# Altium footprint library Cty1.PcbLib: 1378 footprints (part 62 of 87)
Each footprint in its own frame and in the unit in brackets; x right, y up, seen from the top. Pads: shape width x height; smd on the part's side, far side on the other; paste and mask are expansions set on the pad; w line width, h text height; cw(c..) or ccw(c..) is an arc to the next point about the centre after c.
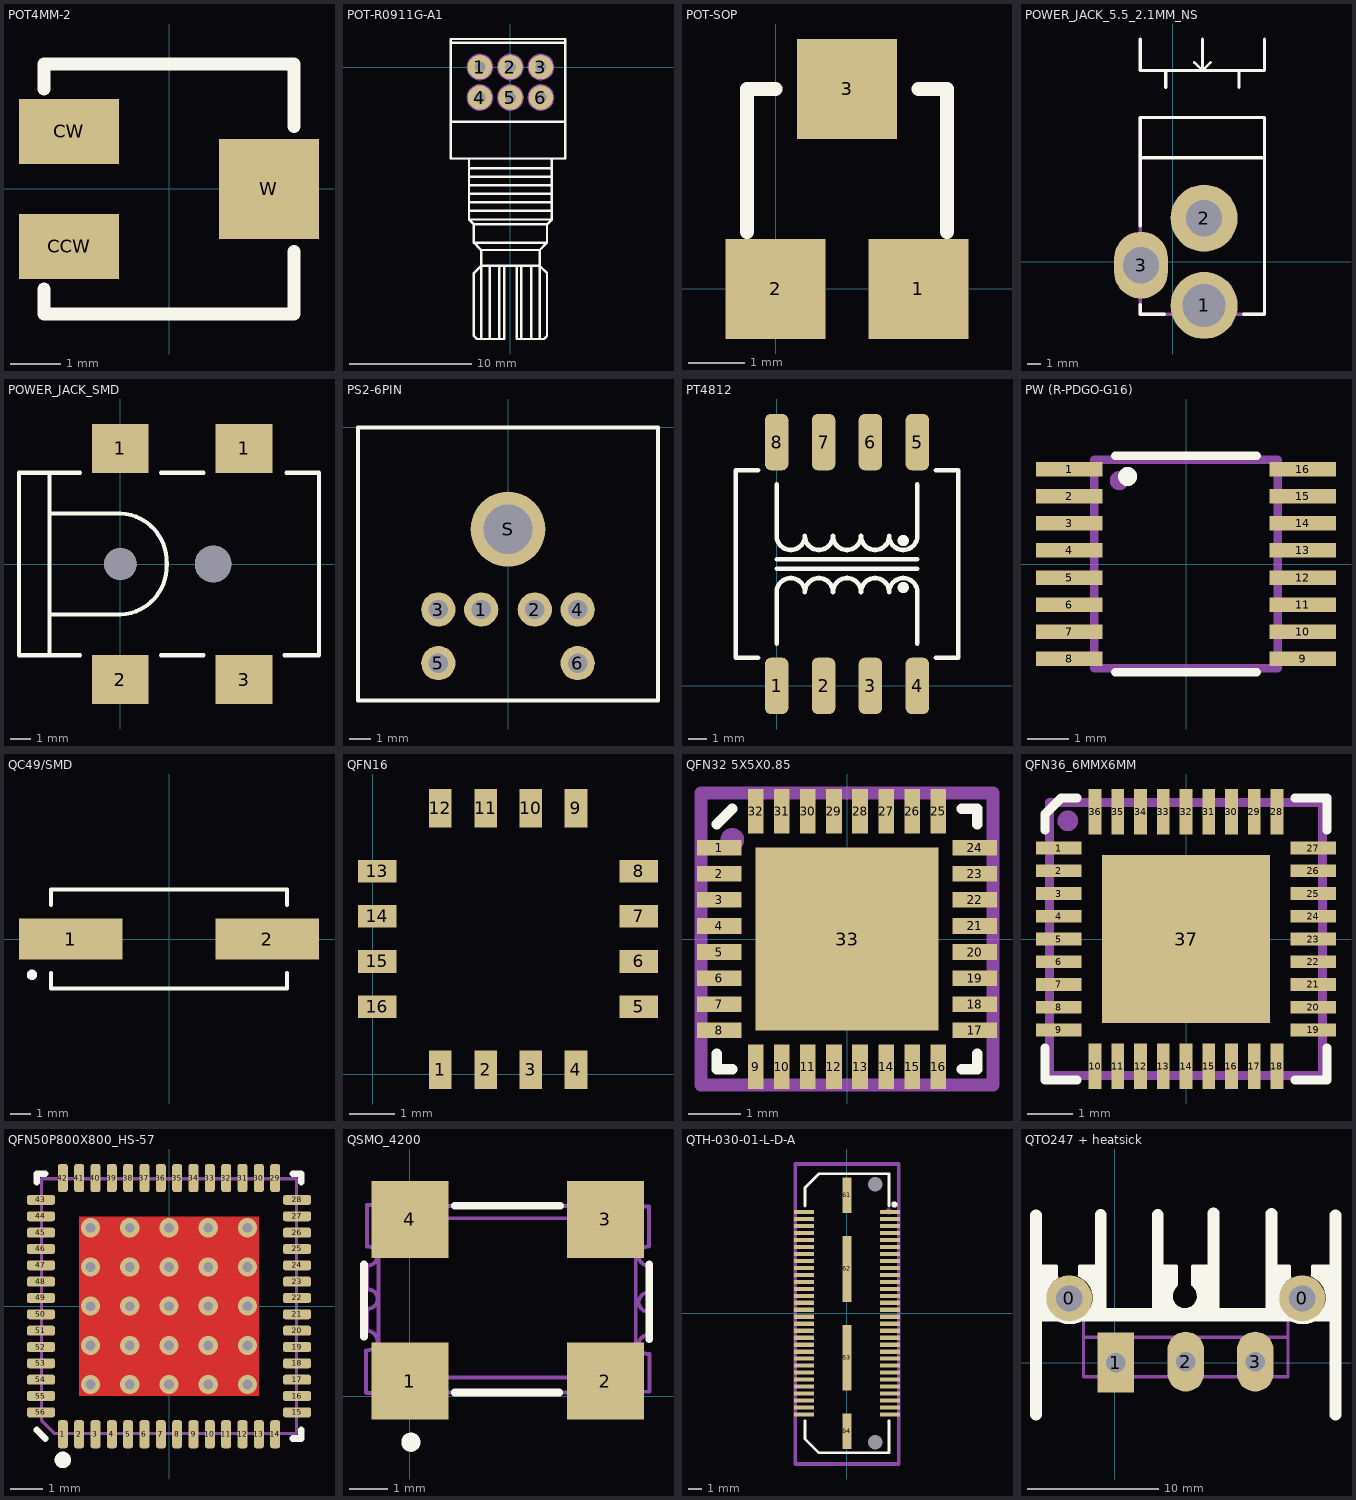
[diagram p61: the footprints below, top view; thin cyan lines are the x and y axes]

## POT4MM-2 [mm]
pads (3):
  rect 2x1.3 smd: CCW(-2,-1.15) CW(-2,1.15)
  rect 2x2 smd: W(2,0)
Top Overlay:
  lines w0.254: -2.5,-2 -2.5,-2.5 2.5,-2.5 2.5,-1.25 ; -2.5,2 -2.5,2.5 2.5,2.5 2.5,1.25

## POT-R0911G-A1 [mm]
pads (6):
  round 2 hole 0.9: 1(-2.5,0) 2(0,0) 3(2.5,0) 4(-2.5,-2.5) 5(0,-2.5) 6(2.5,-2.5)
Top Overlay:
  lines w0.2: -4.9,-4.5 4.5,-4.5 ; -4.9,2 4.5,2 ; -3.4,-11.8 3.4,-11.8 3.4,-12.5 ; -3.4,-11.1 3.4,-11.1 ; -3.4,-10.4 3.4,-10.4 ; -3.4,-9.7 3.4,-9.7 ; -3.4,-9 3.4,-9 ; -3.4,-8.3 3.4,-8.3 ; -3.4,-7.5 -3.4,-12.5 ; -2.4,-22.3 -2.4,-16.3 ; -1.7,-22.3 -1.7,-16.3 ; -0.9,-22.3 -0.9,-16.3 ; -0.5,-16.3 -0.5,-22.3 -2.75,-22.3 -3,-22.05 -3,-16.9 -2.4,-16.3 ; 0.5,-16.3 0.5,-22.3 2.75,-22.3 3,-22.05 3,-16.9 2.4,-16.3 ; 0.9,-22.3 0.9,-16.3 ; 1.7,-22.3 1.7,-16.3 ; 2.4,-22.3 2.4,-16.3 ; 3.4,-7.5 3.4,-12.5 ; -3.4,-12.5 -3,-12.9 ; -3.4,-12.5 0,-12.5 3.4,-12.5 ; -3,-14.4 -2.4,-15 ; -3,-14.4 -3,-12.9 ; -3,-14.4 0,-14.4 3,-14.4 ; -3,-12.9 0,-12.9 3,-12.9 ; -2.4,-16.3 -2.4,-15 ; -2.4,-16.3 0,-16.3 2.4,-16.3 ; -2.4,-15 0,-15 2.4,-15 ; 2.4,-16.3 2.4,-15 ; 2.4,-15 3,-14.4 ; 3,-14.4 3,-12.9 ; 3,-12.9 3.4,-12.5 ; -4.9,-7.5 4.5,-7.5 4.5,2.3 -4.9,2.3 -4.9,-7.5
Mechanical 7:
  circle w0.2: c-2.5,0 r1
  circle w0.2: c0,0 r1
  circle w0.2: c2.5,0 r1
  circle w0.2: c-2.5,-2.5 r1
  circle w0.2: c0,-2.5 r1
  circle w0.2: c2.5,-2.5 r1
  lines w0.1: -4.9,-4.5 4.5,-4.5 ; -4.9,2 4.5,2 ; -3.4,-11.8 3.4,-11.8 3.4,-12.5 ; -3.4,-11.1 3.4,-11.1 ; -3.4,-10.4 3.4,-10.4 ; -3.4,-9.7 3.4,-9.7 ; -3.4,-9 3.4,-9 ; -3.4,-8.3 3.4,-8.3 ; -3.4,-7.5 -3.4,-12.5 ; -2.4,-22.3 -2.4,-16.3 ; -1.7,-22.3 -1.7,-16.3 ; -0.9,-22.3 -0.9,-16.3 ; -0.5,-16.3 -0.5,-22.3 -2.75,-22.3 -3,-22.05 -3,-16.9 -2.4,-16.3 ; 0.5,-16.3 0.5,-22.3 2.75,-22.3 3,-22.05 3,-16.9 2.4,-16.3 ; 0.9,-22.3 0.9,-16.3 ; 1.7,-22.3 1.7,-16.3 ; 2.4,-22.3 2.4,-16.3 ; 3.4,-7.5 3.4,-12.5 ; -3.4,-12.5 0,-12.5 3.4,-12.5 ; -3.4,-12.5 -3,-12.9 ; -3,-14.4 0,-14.4 3,-14.4 ; -3,-14.4 -3,-12.9 ; -3,-14.4 -2.4,-15 ; -3,-12.9 0,-12.9 3,-12.9 ; -2.4,-16.3 0,-16.3 2.4,-16.3 ; -2.4,-16.3 -2.4,-15 ; -2.4,-15 0,-15 2.4,-15 ; 2.4,-16.3 2.4,-15 ; 2.4,-15 3,-14.4 ; 3,-14.4 3,-12.9 ; 3,-12.9 3.4,-12.5 ; -4.9,-7.5 -4.9,2.3 4.5,2.3 4.5,-7.5 -4.9,-7.5
3D body "Potentiometer 2x5K Linear.stp": height 12.64, standoff -2.5, extent -5.725,-27.97 5.764,1.504

## POT-SOP [mil]
pads (3):
  rect 70x70 smd: 1(100,0) 2(0,0) 3(50,140)
Top Overlay:
  lines w10: -20,40 -20,140 0,140 ; 100,140 120,140 120,40

## POWER_JACK_5.5_2.1MM_NS [mm]
pads (3):
  round 5 hole 3.2: 1(2.35,-3.25)
  round 5 hole 2.7: 2(2.35,3.25)
  oval 4x5 hole 2.7: 3(-2.35,-0.25)
Top Overlay:
  lines w0.2: 1.625,14.85 2.225,14.25 ; 2.225,16.6 2.225,14.25 ; 2.825,14.85 2.225,14.25
  lines w0.254: -2.4,-3.2 -2.4,-3.9 -0.6,-3.9 ; -2.4,2.7 -2.4,10.75 6.85,10.75 6.85,-3.9 5.3,-3.9 ; -2.4,7.75 6.85,7.75 ; -2.4,16.6 -2.4,14.25 6.85,14.25 6.85,16.6 ; -0.5,13 -0.5,14.25 ; 4.95,13 4.95,14.25
Mechanical 16:
  lines w0.254: -2.4,-3.9 6.85,-3.9 6.85,10.75 -2.4,10.75 -2.4,-3.9
Mechanical 29:
  text ".Designator" at -0.27,1.34 h1.52
3D body "CUI-PJ-002AH.step": height 11, standoff -3.5, extent -2.55,-3.9 6.85,10.5

## POWER_JACK_SMD [mm]
pads (6):
  rect 2.8x2.4 smd: 1(-0.003,5.714) 1(6.097,5.714) 2(-0.003,-5.686) 3(6.097,-5.686)
  round 1.6 hole 1.6 unplated: ""(-0.003,0.014)
  round 1.803 hole 1.803 unplated: ""(4.569,0.014)
Top Overlay:
  lines w0.203: -2.003,-4.486 -3.503,-4.486 ; -2.003,4.515 -3.503,4.515 ; 1.997,-4.486 4.097,-4.486 ; 1.997,4.515 4.097,4.515 ; 8.097,-4.486 9.797,-4.486 9.797,4.515 8.197,4.515 ; -3.503,-4.486 -5.003,-4.486 -5.003,4.515 -3.503,4.515 ; -3.503,-4.486 -3.503,-2.486 ; -3.503,-2.486 -3.503,2.515 ; -3.503,-2.486 -0.003,-2.486 ccw(c-0.11,-0.093) 2.283,0.014 ccw(c-0.11,0.121) -0.003,2.514 -3.503,2.515 ; -3.503,2.515 -3.503,4.515
3D body "smd power jack.step": height 11.06, standoff 0.11, extent -5.002,-4.478 8.536,4.589

## PS2-6PIN [mm] "PS2 Connector"
height 13
pads (7):
  round 1.6 hole 0.9: 1(-1.25,-8.5) 2(1.25,-8.5) 3(-3.25,-8.5) 4(3.25,-8.5) 5(-3.25,-11) 6(3.25,-11)
  round 3.5 hole 2.3: S(0,-4.75)
Top Overlay:
  lines w0.2: -7,-12.75 7,-12.75 7,0 -7,0 -7,-12.75

## PT4812 [mm]
pads (8):
  rrect50% 1.27x3.05 smd: 1(0,0) 2(2.54,0) 3(5.08,0) 4(7.62,0) 5(7.62,13.21) 6(5.08,13.21) 7(2.54,13.21) 8(0,13.21)
Top Overlay:
  circle w0.254: c6.858,5.334 r0.18
  circle w0.254: c6.858,7.874 r0.18
  lines w0.254: -1.016,1.524 -2.22,1.524 -2.22,11.686 -1.016,11.686 ; 0,2.286 0,5.08 cw(c0.762,5.08) 0.762,5.842 cw(c0.762,5.08) 1.524,5.08 cw(c2.286,5.08) 2.286,5.842 cw(c2.286,5.08) 3.048,5.08 cw(c3.81,5.08) 3.81,5.842 cw(c3.81,5.08) 4.572,5.08 cw(c5.334,5.08) 5.334,5.842 cw(c5.334,5.08) 6.096,5.08 cw(c6.858,5.08) 6.858,5.842 cw(c6.858,5.08) 7.62,5.08 7.62,2.286 ; 0,6.35 7.62,6.35 ; 0,6.858 7.62,6.858 0.508,6.858 ; 0,10.922 0,8.128 ccw(c0.762,8.128) 0.762,7.366 ccw(c0.762,8.128) 1.524,8.128 ccw(c2.286,8.128) 2.286,7.366 ccw(c2.286,8.128) 3.048,8.128 ccw(c3.81,8.128) 3.81,7.366 ccw(c3.81,8.128) 4.572,8.128 ccw(c5.334,8.128) 5.334,7.366 ccw(c5.334,8.128) 6.096,8.128 ccw(c6.858,8.128) 6.858,7.366 ccw(c6.858,8.128) 7.62,8.128 7.62,10.922 ; 6.731,5.334 7.038,5.334 ; 6.731,7.874 7.038,7.874 ; 8.636,1.524 9.84,1.524 9.84,11.686 8.636,11.686
3D body "PPT4812.stp": height 8.86, standoff 0.02, extent -2.281,-0.289 9.779,13.243

## PW (R-PDGO-G16) [mm] "Creator MM"
height 1.2
pads (16):
  rect 1.6x0.35 smd mask+0.07: 1(-2.8,2.275) 2(-2.8,1.625) 3(-2.8,0.975) 4(-2.8,0.325) 5(-2.8,-0.325) 6(-2.8,-0.975) 7(-2.8,-1.625) 8(-2.8,-2.275) 9(2.8,-2.275) 10(2.8,-1.625) 11(2.8,-0.975) 12(2.8,-0.325) 13(2.8,0.325) 14(2.8,0.975) 15(2.8,1.625) 16(2.8,2.275)
Top Overlay:
  circle w0.254: c-1.4,2.1 r0.1
  lines w0.2: -1.7,-2.6 1.7,-2.6 ; -1.7,2.6 1.7,2.6
Mechanical 16:
  circle w0.254: c-1.6,2 r0.1
  lines w0.2: -2.2,-2.5 2.2,-2.5 2.2,2.5 -2.2,2.5 -2.2,-2.5
Mechanical 29:
  text ".Designator" at 0.7,0.5 h1
3D body "mtc16.stp": height 0.99, standoff -0.01, extent -3.198,-2.5 3.222,2.5

## QC49/SMD [mm]
pads (2):
  rect 5x2 smd: 1(-4.75,0) 2(4.75,0)
Top Overlay:
  circle w0.25: c-6.625,-1.73 r0.125
  lines w0.2: -5.7,-1.65 -5.7,-2.4 5.7,-2.4 5.7,-1.65 ; -5.7,1.65 -5.7,2.4 5.7,2.4 5.7,1.65

## QFN16 [mm] "QFN 16 LEAD 6x6mm"
height 2
pads (16):
  rect 0.5x0.85 smd: 1(1.5,0.104) 2(2.5,0.104) 3(3.5,0.104) 4(4.5,0.104) 9(4.5,5.89) 10(3.5,5.89) 11(2.5,5.89) 12(1.5,5.89)
  rect 0.85x0.5 smd: 5(5.89,1.5) 6(5.89,2.5) 7(5.89,3.5) 8(5.89,4.5) 13(0.1,4.5) 14(0.1,3.5) 15(0.1,2.5) 16(0.1,1.5)
3D body: height 0.8, standoff 0, extent 0,0 6,6

## QFN32 5X5X0.85 [mm]
pads (33):
  rect 0.85x0.3 smd mask+0.025: 1(-2.45,1.75) 2(-2.45,1.25) 3(-2.45,0.75) 4(-2.45,0.25) 5(-2.45,-0.25) 6(-2.45,-0.75) 7(-2.45,-1.25) 8(-2.45,-1.75) 17(2.45,-1.75) 18(2.45,-1.25) 19(2.45,-0.75) 20(2.45,-0.25) 21(2.45,0.25) 22(2.45,0.75) 23(2.45,1.25) 24(2.45,1.75)
  rect 0.3x0.85 smd mask+0.025: 9(-1.75,-2.45) 10(-1.25,-2.45) 11(-0.75,-2.45) 12(-0.25,-2.45) 13(0.25,-2.45) 14(0.75,-2.45) 15(1.25,-2.45) 16(1.75,-2.45) 25(1.75,2.45) 26(1.25,2.45) 27(0.75,2.45) 28(0.25,2.45) 29(-0.25,2.45) 30(-0.75,2.45) 31(-1.25,2.45) 32(-1.75,2.45)
  rect 3.5x3.5 smd paste-10 mask+0.025: 33(0,0)
Top Overlay:
  lines w0.2: -2.5,-2.2 -2.5,-2.5 -2.2,-2.5 ; -2.5,2.2 -2.2,2.5 ; 2.2,-2.5 2.5,-2.5 2.5,-2.2 ; 2.2,2.5 2.5,2.5 2.5,2.2
Top Paste:
  region: 1.7,-0.1 0.1,-0.1 0.1,-1.7 1.7,-1.7
  region: -0.1,-1.7 -0.1,-0.1 -1.7,-0.1 -1.7,-1.7
  region: 0.1,1.7 0.1,0.1 1.7,0.1 1.7,1.7
  rectangle: -1.7,0.1 -0.1,1.7
Mechanical 16:
  circle w0.254: c-2.2,1.9 r0.1
  lines w0.254: -2.8,-2.8 2.8,-2.8 2.8,2.8 -2.8,2.8 -2.8,-2.8
Mechanical 29:
  text ".Designator" at -1.4,-0.6 h1.2
3D body: height 0.9, standoff 0, extent -2.5,-2.5 2.5,2.5

## QFN36_6MMX6MM [mm] "Creator MM"
pads (37):
  rect 1x0.28 smd mask+0.025: 1(-2.8,2) 2(-2.8,1.5) 3(-2.8,1) 4(-2.8,0.5) 5(-2.8,0) 6(-2.8,-0.5) 7(-2.8,-1) 8(-2.8,-1.5) 9(-2.8,-2) 19(2.8,-2) 20(2.8,-1.5) 21(2.8,-1) 22(2.8,-0.5) 23(2.8,0) 24(2.8,0.5) 25(2.8,1) 26(2.8,1.5) 27(2.8,2)
  rect 0.28x1 smd mask+0.025: 10(-2,-2.8) 11(-1.5,-2.8) 12(-1,-2.8) 13(-0.5,-2.8) 14(0,-2.8) 15(0.5,-2.8) 16(1,-2.8) 17(1.5,-2.8) 18(2,-2.8) 28(2,2.8) 29(1.5,2.8) 30(1,2.8) 31(0.5,2.8) 32(0,2.8) 33(-0.5,2.8) 34(-1,2.8) 35(-1.5,2.8) 36(-2,2.8)
  rect 3.7x3.7 smd paste-10 mask+0.025: 37(0,0)
Top Overlay:
  lines w0.2: -3.1,-2.4 -3.1,-3.1 -2.4,-3.1 ; -3.1,2.4 -3.1,2.75 -2.75,3.1 -2.4,3.1 ; 2.4,-3.1 3.1,-3.1 3.1,-2.4 ; 2.4,3.1 3.1,3.1 3.1,2.4
Top Paste:
  rectangle: -1.7,0.1 -0.1,1.7
  region: -0.1,-1.7 -0.1,-0.1 -1.7,-0.1 -1.7,-1.7
  region: 1.7,-0.1 0.1,-0.1 0.1,-1.7 1.7,-1.7
  region: 0.1,1.7 0.1,0.1 1.7,0.1 1.7,1.7
Mechanical 16:
  circle w0.254: c-2.6,2.6 r0.1
  lines w0.2: -3,-3 -3,3 3,3 3,-3 -3,-3
Mechanical 29:
  text ".Designator" at -1.2,-0.6 h1.2
3D body "QFN36 (6x6).step": height 0.9, standoff 0.01, extent -3.103,-3.103 3.102,3.102

## QFN50P800X800_HS-57 [mm]
pads (56):
  rrect50% 0.305x0.86 smd mask+0.051: 1(-3.25,-3.92) 14(3.25,-3.92) 29(3.25,3.92) 42(-3.25,3.92)
  rrect50% 0.305x0.86 smd mask+0.038: 2(-2.75,-3.92) 3(-2.25,-3.92) 4(-1.75,-3.92) 5(-1.25,-3.92) 6(-0.75,-3.92) 7(-0.25,-3.92) 8(0.25,-3.92) 9(0.75,-3.92) 10(1.25,-3.92) 11(1.75,-3.92) 12(2.25,-3.92) 13(2.75,-3.92) 30(2.75,3.92) 31(2.25,3.92) 32(1.75,3.92) 33(1.25,3.92) 34(0.75,3.92) 35(0.25,3.92) 36(-0.25,3.92) 37(-0.75,3.92) 38(-1.25,3.92) 39(-1.75,3.92) 40(-2.25,3.92) 41(-2.75,3.92)
  rrect50% 0.86x0.305 smd mask+0.051: 15(3.92,-3.25) 28(3.92,3.25) 43(-3.92,3.25) 56(-3.92,-3.25)
  rrect50% 0.86x0.305 smd mask+0.038: 16(3.92,-2.75) 17(3.92,-2.25) 18(3.92,-1.75) 19(3.92,-1.25) 20(3.92,-0.75) 21(3.92,-0.25) 22(3.92,0.25) 23(3.92,0.75) 24(3.92,1.25) 25(3.92,1.75) 26(3.92,2.25) 27(3.92,2.75) 44(-3.92,2.75) 45(-3.92,2.25) 46(-3.92,1.75) 47(-3.92,1.25) 48(-3.92,0.75) 49(-3.92,0.25) 50(-3.92,-0.25) 51(-3.92,-0.75) 52(-3.92,-1.25) 53(-3.92,-1.75) 54(-3.92,-2.25) 55(-3.92,-2.75)
via -2.4,-1.2 diameter 0.584 hole 0.3
via -2.4,0 diameter 0.584 hole 0.3
via -2.4,-2.4 diameter 0.584 hole 0.3
via -2.4,1.2 diameter 0.584 hole 0.3
via -2.4,2.4 diameter 0.584 hole 0.3
via -1.2,-1.2 diameter 0.584 hole 0.3
via -1.2,0 diameter 0.584 hole 0.3
via -1.2,-2.4 diameter 0.584 hole 0.3
via -1.2,1.2 diameter 0.584 hole 0.3
via -1.2,2.4 diameter 0.584 hole 0.3
via 0,-1.2 diameter 0.584 hole 0.3
via 0,0 diameter 0.584 hole 0.3
via 0,-2.4 diameter 0.584 hole 0.3
via 0,1.2 diameter 0.584 hole 0.3
via 0,2.4 diameter 0.584 hole 0.3
via 1.2,-1.2 diameter 0.584 hole 0.3
via 1.2,0 diameter 0.584 hole 0.3
via 1.2,-2.4 diameter 0.584 hole 0.3
via 1.2,1.2 diameter 0.584 hole 0.3
via 1.2,2.4 diameter 0.584 hole 0.3
via 2.4,-1.2 diameter 0.584 hole 0.3
via 2.4,0 diameter 0.584 hole 0.3
via 2.4,-2.4 diameter 0.584 hole 0.3
via 2.4,1.2 diameter 0.584 hole 0.3
via 2.4,2.4 diameter 0.584 hole 0.3
Top Layer:
  rectangle: -2.75,-2.75 2.75,2.75
Top Overlay:
  circle w0.25: c-3.25,-4.705 r0.125
  lines w0.2: -4.05,-3.79 -3.79,-4.05 ; -4.05,3.79 -4.05,4.05 -3.79,4.05 ; 3.79,-4.05 4.05,-4.05 4.05,-3.79 ; 3.79,4.05 4.05,4.05 4.05,3.79
Top Paste:
  rectangle: -2.54,-2.54 2.54,2.54
Top Solder:
  rectangle: -2.54,-2.54 2.54,2.54
Mechanical 7:
  circle w0.25: c-3.25,-4.705 r0.125
  lines w0.1: -3.9,-3.5 -3.9,3.9 3.9,3.9 3.9,-3.9 -3.5,-3.9 -3.9,-3.5
  text ".Comment" at -3.4,-3.6 h0.8
  text ".Designator" at -3.725,3.2 h0.8
3D body: height 0.55, standoff 0, extent -3.087,-3.089 -2.403,-2.406
3D body: height 0.3, standoff 0.1, extent -3.381,3.589 -3.119,3.85
3D body: height 0.2, standoff 0, extent -3.386,3.707 -3.125,4.275
3D body: height 0.2, standoff 0, extent 3.696,-3.391 4.264,-3.13
3D body: height 0.3, standoff 0.1, extent 3.601,-3.396 3.863,-3.135
3D body: height 0.2, standoff 0, extent 3.696,-2.891 4.264,-2.63
3D body: height 0.3, standoff 0.1, extent 3.601,-2.896 3.863,-2.635
3D body: height 0.2, standoff 0, extent 3.696,-2.391 4.264,-2.13
3D body: height 0.3, standoff 0.1, extent 3.601,-2.396 3.863,-2.135
3D body: height 0.2, standoff 0, extent 3.696,-1.891 4.264,-1.63
3D body: height 0.3, standoff 0.1, extent 3.601,-1.896 3.863,-1.635
3D body: height 0.2, standoff 0, extent 3.696,-1.391 4.264,-1.13
3D body: height 0.3, standoff 0.1, extent 3.601,-1.396 3.863,-1.135
3D body: height 0.2, standoff 0, extent 3.696,-0.891 4.264,-0.63
3D body: height 0.3, standoff 0.1, extent 3.601,-0.896 3.863,-0.635
3D body: height 0.2, standoff 0, extent 3.696,-0.391 4.264,-0.13
3D body: height 0.3, standoff 0.1, extent 3.601,-0.396 3.863,-0.135
3D body: height 0.2, standoff 0, extent 3.696,0.109 4.264,0.37
3D body: height 0.3, standoff 0.1, extent 3.601,0.104 3.863,0.365
3D body: height 0.2, standoff 0, extent 3.696,0.609 4.264,0.87
3D body: height 0.3, standoff 0.1, extent 3.601,0.604 3.863,0.865
3D body: height 0.2, standoff 0, extent 3.696,1.109 4.264,1.37
3D body: height 0.3, standoff 0.1, extent 3.601,1.104 3.863,1.365
3D body: height 0.2, standoff 0, extent 3.696,1.609 4.264,1.87
3D body: height 0.3, standoff 0.1, extent 3.601,1.604 3.863,1.865
3D body: height 0.2, standoff 0, extent 3.696,2.109 4.264,2.37
3D body: height 0.3, standoff 0.1, extent 3.601,2.104 3.863,2.365
3D body: height 0.2, standoff 0, extent 3.696,2.609 4.264,2.87
3D body: height 0.3, standoff 0.1, extent 3.601,2.604 3.863,2.865
3D body: height 0.2, standoff 0, extent 3.696,3.109 4.264,3.37
3D body: height 0.3, standoff 0.1, extent 3.601,3.104 3.863,3.365
3D body: height 0.2, standoff 0, extent 3.113,-4.235 3.374,-3.667
3D body: height 0.3, standoff 0.1, extent 3.108,-3.834 3.369,-3.572
3D body: height 0.2, standoff 0, extent 2.613,-4.235 2.874,-3.667
3D body: height 0.3, standoff 0.1, extent 2.608,-3.834 2.869,-3.572
3D body: height 0.2, standoff 0, extent 2.113,-4.235 2.374,-3.667
3D body: height 0.3, standoff 0.1, extent 2.108,-3.834 2.369,-3.572
3D body: height 0.2, standoff 0, extent 1.613,-4.235 1.874,-3.667
3D body: height 0.3, standoff 0.1, extent 1.608,-3.834 1.869,-3.572
3D body: height 0.2, standoff 0, extent 1.113,-4.235 1.374,-3.667
3D body: height 0.3, standoff 0.1, extent 1.108,-3.834 1.369,-3.572
3D body: height 0.2, standoff 0, extent 0.613,-4.235 0.874,-3.667
3D body: height 0.3, standoff 0.1, extent 0.608,-3.834 0.869,-3.572
3D body: height 0.2, standoff 0, extent 0.113,-4.235 0.374,-3.667
3D body: height 0.3, standoff 0.1, extent 0.108,-3.834 0.369,-3.572
3D body: height 0.2, standoff 0, extent -0.387,-4.235 -0.126,-3.667
3D body: height 0.3, standoff 0.1, extent -0.392,-3.834 -0.131,-3.572
3D body: height 0.2, standoff 0, extent -0.887,-4.235 -0.626,-3.667
3D body: height 0.3, standoff 0.1, extent -0.892,-3.834 -0.631,-3.572
3D body: height 0.2, standoff 0, extent -1.387,-4.235 -1.126,-3.667
3D body: height 0.3, standoff 0.1, extent -1.392,-3.834 -1.131,-3.572
3D body: height 0.2, standoff 0, extent -1.887,-4.235 -1.626,-3.667
3D body: height 0.3, standoff 0.1, extent -1.892,-3.834 -1.631,-3.572
3D body: height 0.2, standoff 0, extent -2.387,-4.235 -2.126,-3.667
3D body: height 0.3, standoff 0.1, extent -2.392,-3.834 -2.131,-3.572
3D body: height 0.2, standoff 0, extent -2.887,-4.235 -2.626,-3.667
3D body: height 0.3, standoff 0.1, extent -2.892,-3.834 -2.631,-3.572
3D body: height 0.2, standoff 0, extent -3.387,-4.235 -3.126,-3.667
3D body: height 0.3, standoff 0.1, extent -3.392,-3.834 -3.131,-3.572
3D body: height 0.3, standoff 0.1, extent -3.868,-3.361 -3.354,-3.099
3D body: height 0.2, standoff 0, extent -4.316,-3.356 -3.748,-3.095
3D body: height 0.2, standoff 0, extent -4.316,-2.865 -3.748,-2.604
3D body: height 0.3, standoff 0.1, extent -3.868,-2.87 -3.606,-2.608
3D body: height 0.2, standoff 0, extent -4.301,-0.856 -3.733,-0.595
3D body: height 0.3, standoff 0.1, extent -3.862,-0.862 -3.601,-0.601
3D body: height 0.2, standoff 0, extent -4.301,-1.384 -3.733,-1.123
3D body: height 0.3, standoff 0.1, extent -3.862,-1.39 -3.601,-1.129
3D body: height 0.2, standoff 0, extent -4.301,-1.884 -3.733,-1.623
3D body: height 0.3, standoff 0.1, extent -3.862,-1.89 -3.601,-1.629
3D body: height 0.2, standoff 0, extent -4.301,-2.368 -3.733,-2.107
3D body: height 0.3, standoff 0.1, extent -3.862,-2.374 -3.601,-2.113
3D body: height 0.2, standoff 0, extent -4.297,1.146 -3.729,1.407
3D body: height 0.3, standoff 0.1, extent -3.858,1.14 -3.597,1.402
3D body: height 0.2, standoff 0, extent -4.297,0.654 -3.729,0.915
3D body: height 0.3, standoff 0.1, extent -3.858,0.648 -3.597,0.91
3D body: height 0.2, standoff 0, extent -4.297,0.142 -3.729,0.403
3D body: height 0.3, standoff 0.1, extent -3.858,0.136 -3.597,0.398
3D body: height 0.2, standoff 0, extent -4.293,-0.35 -3.725,-0.089
3D body: height 0.3, standoff 0.1, extent -3.854,-0.356 -3.593,-0.094
3D body: height 0.3, standoff 0.1, extent -3.854,3.13 -3.593,3.392
3D body: height 0.2, standoff 0, extent -4.293,3.136 -3.725,3.397
3D body: height 0.2, standoff 0, extent -4.293,2.636 -3.725,2.897
3D body: height 0.3, standoff 0.1, extent -3.854,2.63 -3.593,2.892
3D body: height 0.2, standoff 0, extent -4.293,2.136 -3.725,2.397
3D body: height 0.3, standoff 0.1, extent -3.854,2.13 -3.593,2.392
3D body: height 0.2, standoff 0, extent -4.293,1.636 -3.725,1.897
3D body: height 0.3, standoff 0.1, extent -3.854,1.63 -3.593,1.892
3D body: height 0.2, standoff 0, extent -1.357,3.714 -1.095,4.282
3D body: height 0.3, standoff 0.1, extent -1.363,3.582 -1.101,3.843
3D body: height 0.2, standoff 0, extent -1.857,3.714 -1.595,4.282
3D body: height 0.3, standoff 0.1, extent -1.863,3.582 -1.601,3.843
3D body: height 0.2, standoff 0, extent -2.357,3.714 -2.095,4.282
3D body: height 0.3, standoff 0.1, extent -2.363,3.582 -2.101,3.843
3D body: height 0.2, standoff 0, extent -2.857,3.714 -2.595,4.282
3D body: height 0.3, standoff 0.1, extent -2.863,3.582 -2.601,3.843
3D body: height 0.2, standoff 0, extent 0.645,3.706 0.907,4.274
3D body: height 0.3, standoff 0.1, extent 0.64,3.574 0.901,3.835
3D body: height 0.2, standoff 0, extent 0.145,3.706 0.407,4.274
3D body: height 0.3, standoff 0.1, extent 0.14,3.574 0.401,3.835
3D body: height 0.2, standoff 0, extent -0.355,3.706 -0.093,4.274
3D body: height 0.3, standoff 0.1, extent -0.36,3.574 -0.099,3.835
3D body: height 0.2, standoff 0, extent -0.855,3.706 -0.593,4.274
3D body: height 0.3, standoff 0.1, extent -0.86,3.574 -0.599,3.835
3D body: height 0.3, standoff 0.1, extent 1.637,3.581 1.898,3.842
3D body: height 0.2, standoff 0, extent 1.642,3.713 1.904,4.281
3D body: height 0.3, standoff 0.1, extent 2.137,3.581 2.398,3.842
3D body: height 0.2, standoff 0, extent 2.142,3.713 2.404,4.281
3D body: height 0.3, standoff 0.1, extent 2.637,3.581 2.898,3.842
3D body: height 0.2, standoff 0, extent 2.642,3.713 2.904,4.281
3D body: height 0.3, standoff 0.1, extent 3.137,3.581 3.398,3.842
3D body: height 0.2, standoff 0, extent 3.142,3.713 3.404,4.281
3D body: height 0.2, standoff 0, extent 1.137,3.713 1.399,4.281
3D body: height 0.3, standoff 0.1, extent 1.131,3.58 1.393,3.842
3D body: height 0.5, standoff 0, extent -3.67,-3.643 3.649,3.573

## QSMO_4200 [mm]
pads (4):
  rect 2x2 smd: 1(0,0.4) 2(5.08,0.4) 3(5.08,4.6) 4(0,4.6)
Top Overlay:
  circle w0.25: c0.025,-1.19 r0.125
  lines w0.2: -1.194,1.549 -1.194,3.429 ; 1.162,4.953 3.912,4.953 ; 1.168,0.102 3.886,0.102 ; 6.223,1.489 6.223,3.429
Mechanical 15:
  lines w0.1: -1.143,0.102 -1.143,1.194 ; -1.12,0.09 -0.27,0.09 -0.29,0.11 ; -1.12,3.9 -1.12,4.98 -0.26,4.98 ; -1.118,1.702 -1.118,2.286 ; -1.118,2.794 -1.118,3.378 ; -1.1,1.2 ccw(c-1.1,1.45) -1.1,1.7 ; -1.1,3.4 ccw(c-1.1,3.65) -1.1,3.9 ; -1.09,2.28 ccw(c-1.09,2.53) -1.09,2.78 ; -0.83,0.49 5.87,0.49 5.87,4.63 -0.82,4.63 -0.82,3.91 -0.82,0.51 ; -0.3,0.15 cw(c-0.05,0.15) 0.2,0.15 ; -0.23,4.91 ccw(c0.02,4.91) 0.27,4.91 ; 0.19,0.1 4.78,0.1 ; 0.25,4.95 4.87,4.95 ; 4.8,0.16 cw(c5.05,0.16) 5.3,0.16 ; 4.88,4.91 ccw(c5.13,4.91) 5.38,4.91 ; 5.29,0.12 6.23,0.12 6.23,1.1 ; 5.35,4.94 6.22,4.94 6.22,3.91 ; 6.198,1.62 6.198,2.184 ; 6.2,1.1 cw(c6.2,1.35) 6.2,1.6 ; 6.2,2.2 cw(c6.2,2.45) 6.2,2.7 ; 6.2,3.4 cw(c6.2,3.65) 6.2,3.9 ; 6.223,2.704 6.223,3.378

## QTH-030-01-L-D-A [mm]
pads (66):
  rect 1.45x0.3 smd mask+0.025: 1(3.09,7.25) 2(-3.09,7.25) 3(3.09,6.75) 4(-3.09,6.75) 5(3.09,6.25) 6(-3.09,6.25) 7(3.09,5.75) 8(-3.09,5.75) 9(3.09,5.25) 10(-3.09,5.25) 11(3.09,4.75) 12(-3.09,4.75) 13(3.09,4.25) 14(-3.09,4.25) 15(3.09,3.75) 16(-3.09,3.75) 17(3.09,3.25) 18(-3.09,3.25) 19(3.09,2.75) 20(-3.09,2.75) 21(3.09,2.25) 22(-3.09,2.25) 23(3.09,1.75) 24(-3.09,1.75) 25(3.09,1.25) 26(-3.09,1.25) 27(3.09,0.75) 28(-3.09,0.75) 29(3.09,0.25) 30(-3.09,0.25) 31(3.09,-0.25) 32(-3.09,-0.25) 33(3.09,-0.75) 34(-3.09,-0.75) 35(3.09,-1.25) 36(-3.09,-1.25) 37(3.09,-1.75) 38(-3.09,-1.75) 39(3.09,-2.25) 40(-3.09,-2.25) 41(3.09,-2.75) 42(-3.09,-2.75) 43(3.09,-3.25) 44(-3.09,-3.25) 45(3.09,-3.75) 46(-3.09,-3.75) 47(3.09,-4.25) 48(-3.09,-4.25) 49(3.09,-4.75) 50(-3.09,-4.75) 51(3.09,-5.25) 52(-3.09,-5.25) 53(3.09,-5.75) 54(-3.09,-5.75) 55(3.09,-6.25) 56(-3.09,-6.25) 57(3.09,-6.75) 58(-3.09,-6.75) 59(3.09,-7.25) 60(-3.09,-7.25)
  rect 0.64x2.54 smd mask+0.025: 61(0,8.445) 64(0,-8.445)
  rect 0.64x4.7 smd mask+0.025: 62(0,3.175) 63(0,-3.175)
  round 0 hole 1.05 unplated: 65(2.03,-9.24) 66(2.03,9.24)
Top Overlay:
  circle w0.254: c3.4,7.8 r0.1
  lines w0.2: -3,-7.7 -3,-9 -2,-10 3,-10 3,-7.7 ; -3,7.7 -3,9 -2,10 3,10 3,7.7
Mechanical 16:
  circle w0.254: c3,7.3 r0.1
  lines w0.254: -3.7,-10.8 -3.7,10.7 3.7,10.7 3.7,-10.8 -3.7,-10.8
Mechanical 29:
  text ".Designator" at 1.3,0 h1.52
3D body "QTH-030-01-X-D-A.step": height 4.26, standoff -0.74, extent -3.55,-10.002 3.562,10

## QTO247 + heatsick [mil]
pads (5):
  round 137.8 hole 78.74: 0(-136.34,194) 0(563.66,194)
  rect 110x180 hole 59.06: 1(3,1)
  oval 110x180 hole 59.06: 2(213.66,4) 3(422.32,4)
Top Overlay:
  region: 230,290 290,290 290,150 280,160 230,160 250,180 250,220 230,240
  region: 140,290 190,290 190,240 170,220 170,180 190,160 140,160
  region: -105,290 -105,265 -85,245 -80,245 -70,235 -70,225 -65,220 -65,160 -40,160 -35,165 -50,180 -50,290
  region: -225,290 -175,290 -175,255 -180,255 -200,235 -200,225 -210,215 -210,180 -205,175 -205,160 -225,160
  region: 475,290 525,290 525,255 520,255 500,235 500,225 490,215 490,180 495,175 495,160 475,160
  region: 595,290 595,265 615,245 620,245 630,235 630,225 635,220 635,160 660,160 665,165 650,180 650,290
  lines w10: -225,290 -175,290 -175,260 ; -173.69,257.87 ccw(c-135,195) -105.92,262.86 ; -163.31,220 ccw(c-134.15,190.85) -105,220 ; -105,265 -105,290 -55,290 ; 130,290 185,290 185,235 180,230 ; 181.96,229.73 ccw(c210.85,200.85) 239.73,229.73 ; 240,230 235,235 235,290 280,290 ; 475,290 525,290 525,260 ; 526.31,257.87 ccw(c565,195) 594.08,262.86 ; 595,265 595,290 645,290
  lines w35: -236.34,-156 -236.34,444 ; -42,149 -42,445 ; 129,149 129,445 ; 297,148 297,450 ; 471,148 471,448 ; 663.66,-156 663.66,444
  lines w40: -230,145 655,145
Mechanical 1:
  lines w10: -93.43,76.83 520.75,76.83 ; -93.43,-41.28 520.75,-41.28 520.75,135.89 -93.43,135.89 -93.43,-41.28
3D body "SW3dPS-TO-247.STEP": height 940.6, standoff -479.4, extent -92,-73 508,107
3D body "User Library-heat sink-1.STEP": height 1206.11, standoff 0.6, extent -252.79,-166.67 648.79,479